# Altium footprint library Toi Library.PcbLib: 740 footprints (part 24 of 47)
Each footprint in its own frame and in the unit in brackets; x right, y up, seen from the top. Pads: shape width x height; smd on the part's side, far side on the other; paste and mask are expansions set on the pad; w line width, h text height; cw(c..) or ccw(c..) is an arc to the next point about the centre after c.
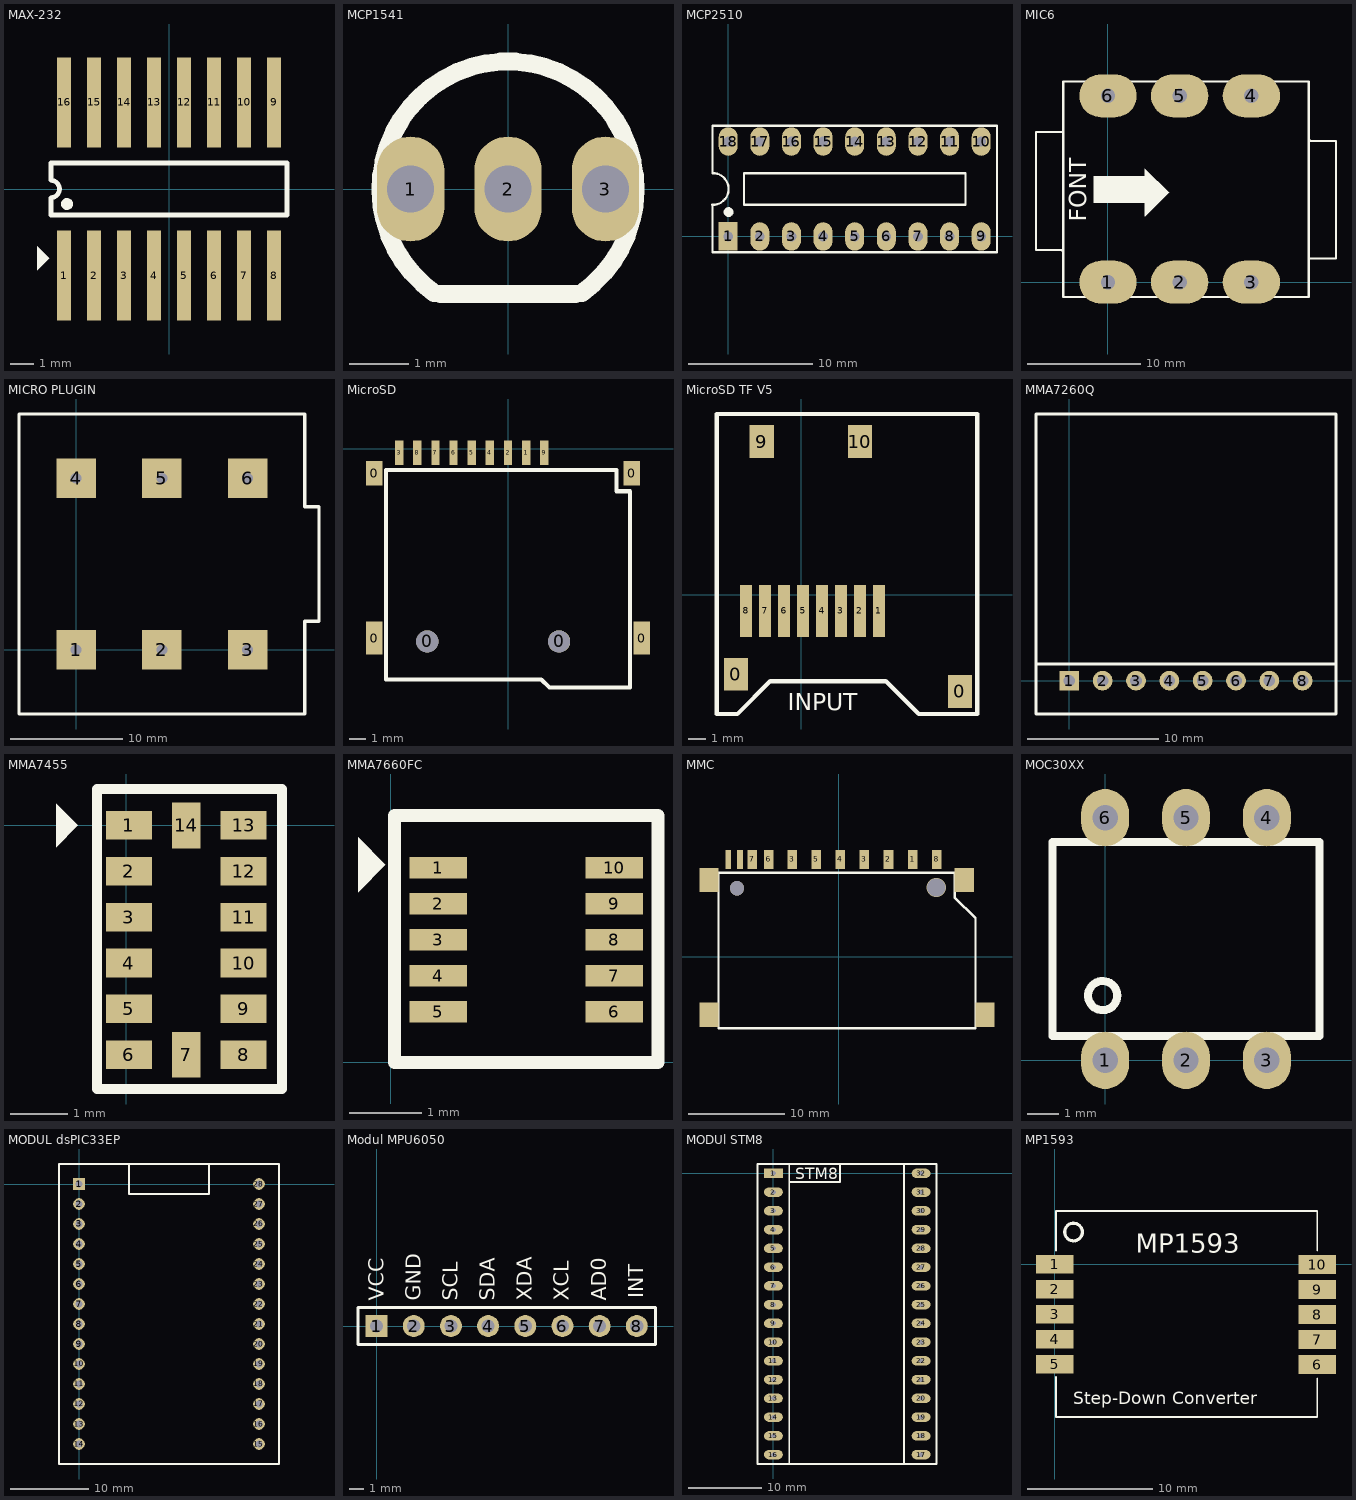
[diagram p23: the footprints below, top view; thin cyan lines are the x and y axes]

## MAX-232 [mm] "SO-G16"
pads (16):
  rect 0.6x3.81 smd: 1(-4.445,-3.667) 2(-3.175,-3.667) 3(-1.905,-3.667) 4(-0.635,-3.667) 5(0.635,-3.667) 6(1.905,-3.667) 7(3.175,-3.667) 8(4.445,-3.667) 9(4.445,3.667) 10(3.175,3.667) 11(1.905,3.667) 12(0.635,3.667) 13(-0.635,3.667) 14(-1.905,3.667) 15(-3.175,3.667) 16(-4.445,3.667)
Top Overlay:
  circle w0.25: c-4.316,-0.635 r0.125
  region: -5.588,-3.429 -5.08,-2.921 -5.588,-2.413
  lines w0.2: -5,-1.1 -5,-0.367 ccw(c-5,0) -5,0.367 -5,1.1 5,1.1 5,-1.1 -5,-1.1
3D body "User Library-SOIC16_Wide_JEDEC_MS-013AA.STEP": height 2.57, standoff -0.08, extent -5.25,-5.315 5.25,5.315

## MCP1541 [mil]
pads (3):
  oval 45x70 hole 31.5: 1(-65,0) 2(0,0) 3(65,0)
Top Overlay:
  lines w12: -49.41,-69.17 cw(c0,0) 49.41,-69.17 ; -45,-70 45,-70

## MCP2510 [mil] "18 PIN, W 300mil, Pin to pin 100mil"
height 100
pads (18):
  rect 60x90 hole 31: 1(0,0)
  oval 60x90 hole 31: 2(100,0) 3(200,0) 4(300,0) 5(400,0) 6(500,0) 7(600,0) 8(700,0) 9(800,0) 10(800,300) 11(700,300) 12(600,300) 13(500,300) 14(400,300) 15(300,300) 16(200,300) 17(100,300) 18(0,300)
Top Overlay:
  circle w15: c1,77 r8
  lines w7: -50.38,100.05 ccw(c-48.69,150.02) -50,200 ; -50,100 -50,-50 850,-50 850,350 -50,350 -50,201 ; 50,100 50,200 750,200 750,100 50,100
3D body "User Library-DIP18-1.STEP": height 179.92, standoff -150, extent -59.48,-6.94 855.48,300.94

## MIC6 [mm] "Jac Mic 6 pin to"
pads (6):
  oval 5.08x3.81 hole 1.27: 1(0,0) 2(6.35,0) 3(12.7,0) 4(12.7,16.51) 5(6.35,16.51) 6(0,16.51)
Top Overlay:
  region: -1.27,9.373 -1.27,7.036 3.302,7.036 3.277,7.061 3.277,5.842 3.302,5.842 5.385,7.925 5.41,7.925 3.277,10.058 3.277,9.373
  lines w0.178: -3.962,-1.295 -3.962,17.755 ; -3.962,2.261 -3.962,13.335 -4.013,13.284 -6.375,13.284 -6.375,2.845 -4.115,2.845 -3.962,2.692 ; -3.962,17.78 17.78,17.78 17.78,14.986 ; -3.937,-1.321 -3.912,-1.295 -3.886,-1.321 17.78,-1.321 17.78,2.083 ; 17.78,12.675 17.932,12.522 20.193,12.522 20.193,2.083 17.831,2.083 17.78,2.032 17.78,15.088
  text "FONT" at -1.905,5.334 h1.52

## MICRO PLUGIN [mil]
pads (6):
  rect 137.8x137.8 / inner round 62 / far side rect 137.8x137.8 hole 38: 1(0,0) 2(300,0) 3(600,0) 4(0,600) 5(300,600) 6(600,600)
Top Overlay:
  lines w11.82: -200,-225 -200,825 800,825 800,500 850,500 850,100 800,100 800,-225 -200,-225

## MicroSD [mm]
pads (15):
  rect 1x2 smd: 0(-8.1,-11.5) 0(8.1,-11.5)
  rect 1x1.5 smd: 0(-8.1,-1.5) 0(7.5,-1.5)
  round 1.35 hole 1.35: 0(-4.9,-11.7) 0(3.1,-11.7)
  rect 0.5x1.5 smd: 1(1.1,-0.254) 2(0,-0.254) 3(-6.6,-0.254) 4(-1.1,-0.254) 5(-2.2,-0.254) 6(-3.3,-0.254) 7(-4.4,-0.254) 8(-5.5,-0.254) 9(2.2,-0.254)
Top Overlay:
  lines w0.254: -7.4,-14 -7.4,-1.295 6.579,-1.295 6.579,-2.591 7.4,-2.591 7.4,-14.5 2.515,-14.5 2.015,-14 0,-14 -7.4,-14
3D body "User Library-Socket-MicroSD-Type1-with-SDCard.STEP": height 1.91, standoff -0.43, extent -6.95,-19.6 7.15,0.5

## MicroSD TF V5 [mm]
pads (12):
  rect 1.4x1.9 smd: 0(-3.8,-4.6) 0(9.2,-5.6) 9(-2.3,8.9) 10(3.4,8.9)
  rect 0.7x3 smd: 1(4.5,-0.929) 2(3.4,-0.929) 3(2.3,-0.929) 4(1.2,-0.929) 5(0.1,-0.929) 6(-1,-0.929) 7(-2.1,-0.929) 8(-3.2,-0.929)
Top Overlay:
  lines w0.254: -4.9,-6.909 -3.979,-6.909 -3.709,-6.909 -1.8,-5 4.9,-5 6.809,-6.909 10.2,-6.909 10.2,10.5 6.4,10.5 -1.4,10.5 -4.9,10.5 -4.9,-6.909
  text "INPUT" at -0.8,-6.7 h1
3D body "User Library-473521001_microSD.STEP": height 2, standoff 0.12, extent -4.35,-5.54 9.75,9.66

## MMA7260Q [mm] "Connector; Header; 8 Position"
pads (8):
  rect 1.5x1.5 hole 0.9: 1(0,0)
  round 1.5 hole 0.9: 2(2.54,0) 3(5.08,0) 4(7.62,0) 5(10.16,0) 6(12.7,0) 7(15.24,0) 8(17.78,0)
Top Overlay:
  lines w0.2: -2.54,1.27 20.32,1.27 ; -2.54,-2.54 20.32,-2.54 20.32,20.32 -2.54,20.32 -2.54,-2.54
3D body: height 1, standoff 0, extent -2.54,-2.54 20.32,20.32
3D body: height 2, standoff 1, extent 7.62,7.62 13.97,13.97

## MMA7455 [mm]
pads (14):
  rect 0.8x0.5 smd: 1(0.051,0) 2(0.051,-0.8) 3(0.051,-1.6) 4(0.051,-2.4) 5(0.051,-3.2) 6(0.051,-4) 8(2.051,-4) 9(2.051,-3.2) 10(2.051,-2.4) 11(2.051,-1.6) 12(2.051,-0.8) 13(2.051,0)
  rect 0.5x0.8 smd: 7(1.051,-4) 14(1.051,0)
Top Overlay:
  region: -1.219,0.381 -0.838,0 -1.219,-0.381
  lines w0.178: -0.508,-4.572 -0.508,0.635 2.718,0.635 2.718,-4.597 ; 2.718,-4.597 -0.508,-4.597 2.718,-4.597

## MMA7660FC [mm]
pads (10):
  rect 0.8x0.3 smd: 1(0.655,2.704) 2(0.655,2.204) 3(0.655,1.704) 4(0.655,1.204) 5(0.655,0.704) 6(3.099,0.704) 7(3.099,1.204) 8(3.099,1.704) 9(3.099,2.204) 10(3.099,2.704)
Top Overlay:
  region: -0.457,3.124 -0.076,2.743 -0.457,2.362
  lines w0.178: 0.051,0 0.051,3.429 3.708,3.429 3.708,0 0.051,0
3D body "User Library-DFN 10 Body 3x3mm Pitch 0_5mm.STEP": height 0.9, standoff -0.05, extent 0.33,0.152 3.43,3.252

## MMC [mm]
pads (15):
  rect 1x2 smd: 1(7.67,10.109) 2(5.17,10.109) 3(-4.83,10.109) 3(2.67,10.109) 4(0.17,10.109) 5(-2.33,10.109) 6(-7.255,10.109) 7(-8.955,10.109) 8(10.17,10.109)
  rect 2x2.5 smd: ""(-13.455,-6.02) ""(-13.455,7.95) ""(13.024,7.95) ""(15.183,-6.02)
  rect 0.6x2 smd: ""(-11.455,10.109) ""(-10.255,10.109)
via 10.135,7.188 diameter 2 hole 1.898
via -10.555,7.109 diameter 1.476 hole 1.476
Top Overlay:
  lines w0.254: -12.471,-7.417 14.199,-7.417 14.199,4.013 12.04,6.172 12.04,8.712 -12.471,8.712 -12.471,-7.417
3D body "User Library-SD Kart.step": height 3, standoff -1, extent -13.436,-20.196 15.164,9.804

## MOC30XX [mm]
pads (6):
  oval 1.5x1.8 hole 0.8: 1(0,0) 2(2.54,0) 3(5.08,0) 4(5.08,7.62) 5(2.54,7.62) 6(0,7.62)
Top Overlay:
  circle w0.254: c-0.077,2.032 r0.458
  lines w0.254: -1.651,0.762 6.731,0.762 6.731,6.858 -1.651,6.858 -1.651,0.762
3D body "SW3DPS-DIP6-DEFAULT.step": height 4.41, standoff -3.18, extent -1.5,-0.19 6.58,7.81

## MODUL dsPIC33EP [mm] "Connector; Header; 14 Position"
height 1.14
pads (28):
  rect 1.5x1.5 hole 0.9: 1(0,0)
  round 1.5 hole 0.9: 2(0,-2.54) 3(0,-5.08) 4(0,-7.62) 5(0,-10.16) 6(0,-12.7) 7(0,-15.24) 8(0,-17.78) 9(0,-20.32) 10(0,-22.86) 11(0,-25.4) 12(0,-27.94) 13(0,-30.48) 14(0,-33.02) 15(22.86,-33.02) 16(22.86,-30.48) 17(22.86,-27.94) 18(22.86,-25.4) 19(22.86,-22.86) 20(22.86,-20.32) 21(22.86,-17.78) 22(22.86,-15.24) 23(22.86,-12.7) 24(22.86,-10.16) 25(22.86,-7.62) 26(22.86,-5.08) 27(22.86,-2.54) 28(22.86,0)
Top Overlay:
  lines w0.2: -2.54,2.54 -2.54,-35.56 25.4,-35.56 25.4,-0.635
  lines w0.254: -2.54,2.54 25.4,2.54 25.4,-0.635 ; 6.35,2.54 6.35,-1.27 16.51,-1.27 16.51,2.54

## Modul MPU6050 [mm] "Connector; Header; 8 Position"
height 1.14
pads (8):
  rect 1.5x1.5 hole 0.9: 1(0,0)
  round 1.5 hole 0.9: 2(2.54,0) 3(5.08,0) 4(7.62,0) 5(10.16,0) 6(12.7,0) 7(15.24,0) 8(17.78,0)
Top Overlay:
  lines w0.2: -1.27,-1.27 19.05,-1.27 19.05,1.27 -1.27,1.27 -1.27,-1.27
  text "VCC" at 0.483,1.727 h1.02
  text "GND" at 3.015,1.727 h1.02
  text "SCL" at 5.548,1.727 h1.02
  text "SDA" at 8.081,1.727 h1.02
  text "XDA" at 10.614,1.727 h1.02
  text "XCL" at 13.146,1.727 h1.02
  text "AD0" at 15.679,1.727 h1.02
  text "INT" at 18.212,1.896 h1.02
3D body "female_header_a-bl254-eg-g08d.stp": height 7.92, standoff -3.78, extent -1.395,-1.257 19.175,1.243

## MODUl STM8 [mm]
pads (32):
  rect 2.54x1.27 hole 0.635: 1(0,0)
  oval 2.54x1.27 hole 0.635: 2(0,-2.54) 3(0,-5.08) 4(0,-7.62) 5(0,-10.16) 6(0,-12.7) 7(0,-15.24) 8(0,-17.78) 9(0,-20.32) 10(0,-22.86) 11(0,-25.4) 12(0,-27.94) 13(0,-30.48) 14(0,-33.02) 15(0,-35.56) 16(0,-38.1) 17(20,-38.1) 18(20,-35.56) 19(20,-33.02) 20(20,-30.48) 21(20,-27.94) 22(20,-25.4) 23(20,-22.86) 24(20,-20.32) 25(20,-17.78) 26(20,-15.24) 27(20,-12.7) 28(20,-10.16) 29(20,-7.62) 30(20,-5.08) 31(20,-2.54) 32(20,0)
Top Overlay:
  lines w0.254: 2.14,-39.31 2.14,1.27 ; 2.14,-1.168 9.017,-1.168 9.017,1.27 ; 17.695,-39.31 17.695,1.27 ; -2.155,-39.37 22.085,-39.37 22.085,1.27 -2.155,1.27 -2.155,-39.37
  text "STM8" at 2.94,-0.77 h1.52

## MP1593 [mm]
height 5
pads (10):
  rect 3x1.5 smd: 1(0,0) 2(0,-2) 3(0,-4) 4(0,-6) 5(0,-8) 6(21,-8.025) 7(21,-6.025) 8(21,-4.025) 9(21,-2.025) 10(21,-0.025)
Top Overlay:
  circle w0.254: c1.5,2.575 r0.707
  lines w0.127: 0.1,-9.025 0.1,-12.225 21,-12.225 21,-9.125 ; 0.1,1.075 0.1,4.26 21,4.26 21,1.075
  text "Step-Down Converter" at 1.5,-11.2 h1
  text "MP1593" at 6.5,0.9 h1.52
3D body: height 5, standoff 0, extent 0,-12.2 21,4.3
3D body: height 5.1, standoff 0, extent 1.104,2.001 2.1,2.999